# Altium footprint library IFAT6.PcbLib: 65 footprints (part 4 of 5)
Each footprint in its own frame and in the unit in brackets; x right, y up, seen from the top. Pads: shape width x height; smd on the part's side, far side on the other; paste and mask are expansions set on the pad; w line width, h text height; cw(c..) or ccw(c..) is an arc to the next point about the centre after c.
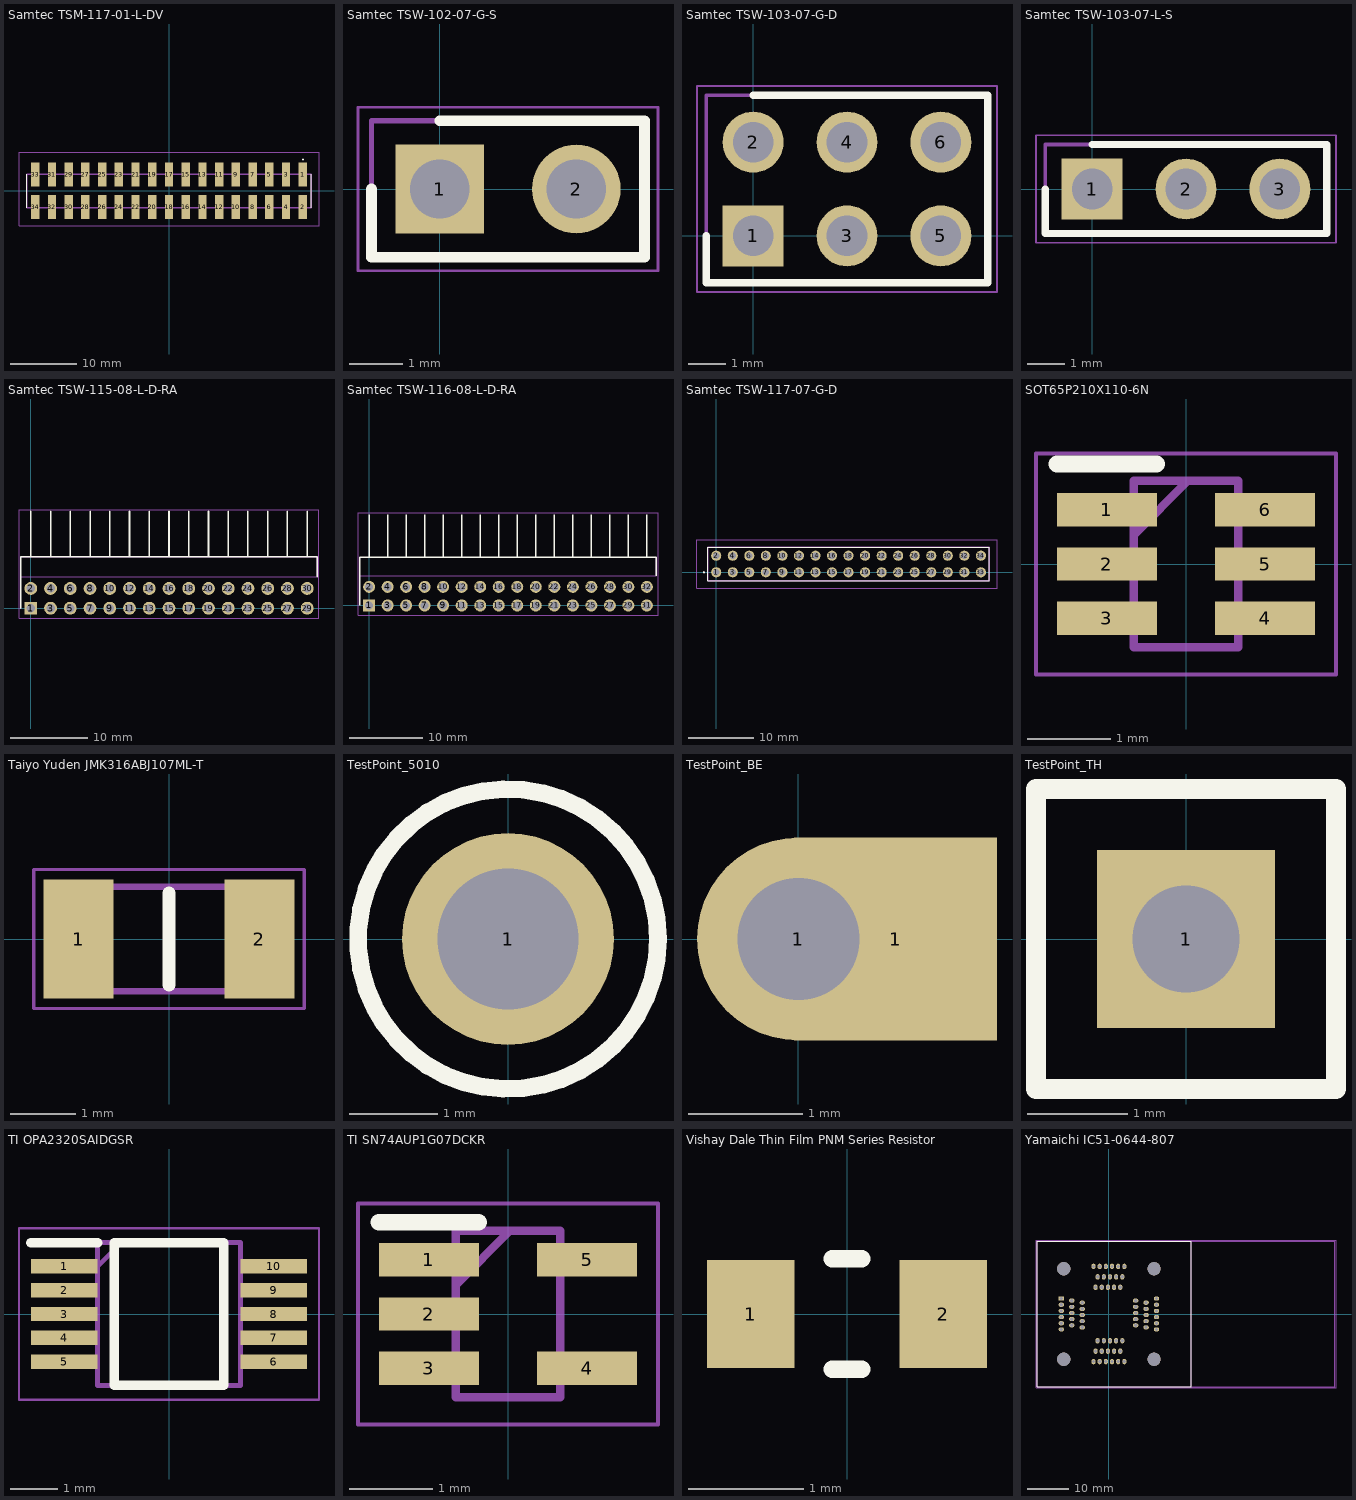
[diagram p3: the footprints below, top view; thin cyan lines are the x and y axes]

## Samtec TSM-117-01-L-DV [mm] "CONN HEADER SMD 34POS 2.54MM"
pads (34):
  rect 1.27x3.68 smd: 1(20.32,2.475) 2(20.32,-2.475) 3(17.78,2.475) 4(17.78,-2.475) 5(15.24,2.475) 6(15.24,-2.475) 7(12.7,2.475) 8(12.7,-2.475) 9(10.16,2.475) 10(10.16,-2.475) 11(7.62,2.475) 12(7.62,-2.475) 13(5.08,2.475) 14(5.08,-2.475) 15(2.54,2.475) 16(2.54,-2.475) 17(0,2.475) 18(0,-2.475) 19(-2.54,2.475) 20(-2.54,-2.475) 21(-5.08,2.475) 22(-5.08,-2.475) 23(-7.62,2.475) 24(-7.62,-2.475) 25(-10.16,2.475) 26(-10.16,-2.475) 27(-12.7,2.475) 28(-12.7,-2.475) 29(-15.24,2.475) 30(-15.24,-2.475) 31(-17.78,2.475) 32(-17.78,-2.475) 33(-20.32,2.475) 34(-20.32,-2.475)
Top Overlay:
  circle w0.2: c20.37,4.775 r0.05
  lines w0.1: -21.59,-2.54 -21.59,2.54 ; 21.59,-2.54 21.59,2.54
Mechanical 13:
  lines w0.2: -21.59,-2.54 21.59,-2.54 21.59,2.54 -21.59,2.54 -21.59,-2.54
Mechanical 15:
  lines w0.05: -22.79,-5.315 22.79,-5.315 22.79,5.875 -22.79,5.875 -22.79,-5.315
3D body "TSM-117-01-L-DV.stp": height 9.66, standoff 0.01, extent -21.59,-3.848 21.59,3.848

## Samtec TSW-102-07-G-S [mm] "CONN HEADER VERT 2POS 2.54MM"
pads (2):
  rect 1.65x1.65 hole 1.1: 1(0,0)
  round 1.65 hole 1.1: 2(2.54,0)
Top Overlay:
  lines w0.2: -1.27,0 -1.27,-1.27 3.81,-1.27 3.81,1.27 0,1.27
Mechanical 13:
  lines w0.1: -1.27,-1.27 3.81,-1.27 3.81,1.27 -1.27,1.27 -1.27,-1.27
Mechanical 15:
  lines w0.05: -1.52,-1.52 4.06,-1.52 4.06,1.52 -1.52,1.52 -1.52,-1.52
3D body "TSW-102-07-G-S-002.stp": height 8.38, standoff -2.54, extent -1.27,-1.27 3.81,1.27

## Samtec TSW-103-07-G-D [mm] "CONN HEADER VERT 6POS 2.54MM"
pads (6):
  rect 1.65x1.65 hole 1.1: 1(0,0)
  round 1.65 hole 1.1: 2(0,2.54) 3(2.54,0) 4(2.54,2.54) 5(5.08,0) 6(5.08,2.54)
Top Overlay:
  lines w0.2: -1.27,0 -1.27,-1.27 6.35,-1.27 6.35,3.81 0,3.81
Mechanical 13:
  lines w0.1: -1.27,-1.27 6.35,-1.27 6.35,3.81 -1.27,3.81 -1.27,-1.27
Mechanical 15:
  lines w0.05: -1.52,-1.52 6.6,-1.52 6.6,4.06 -1.52,4.06 -1.52,-1.52
3D body "TSW-103-07-G-D-001.stp": height 8.38, standoff -2.54, extent -1.27,-1.27 6.35,3.81

## Samtec TSW-103-07-L-S [mm] "CONN HEADER VERT 3POS 2.54MM"
pads (3):
  rect 1.65x1.65 hole 1.1: 1(0,0)
  round 1.65 hole 1.1: 2(2.54,0) 3(5.08,0)
Top Overlay:
  lines w0.2: -1.27,0 -1.27,-1.205 6.35,-1.205 6.35,1.205 0,1.205
Mechanical 13:
  lines w0.1: -1.27,-1.205 -1.27,1.205 6.35,1.205 6.35,-1.205 -1.27,-1.205
Mechanical 15:
  lines w0.05: -1.52,-1.455 -1.52,1.455 6.6,1.455 6.6,-1.455 -1.52,-1.455
3D body "TSW-103-07-G-S-LL.stp": height 8.38, standoff -2.54, extent -1.27,-1.205 6.35,1.205

## Samtec TSW-115-08-L-D-RA [mm] "CONN HEADER R/A 30POS 2.54MM"
pads (30):
  rect 1.65x1.65 hole 1.1: 1(0,0)
  round 1.65 hole 1.1: 2(0,2.54) 3(2.54,0) 4(2.54,2.54) 5(5.08,0) 6(5.08,2.54) 7(7.62,0) 8(7.62,2.54) 9(10.16,0) 10(10.16,2.54) 11(12.7,0) 12(12.7,2.54) 13(15.24,0) 14(15.24,2.54) 15(17.78,0) 16(17.78,2.54) 17(20.32,0) 18(20.32,2.54) 19(22.86,0) 20(22.86,2.54) 21(25.4,0) 22(25.4,2.54) 23(27.94,0) 24(27.94,2.54) 25(30.48,0) 26(30.48,2.54) 27(33.02,0) 28(33.02,2.54) 29(35.56,0) 30(35.56,2.54)
Top Overlay:
  lines w0.2: -1.27,0 -1.27,6.6 36.83,6.6 36.83,4.06 ; 0,6.6 0,12.44 ; 2.54,6.6 2.54,12.44 ; 5.08,6.6 5.08,12.44 ; 7.62,6.6 7.62,12.44 ; 10.16,6.6 10.16,12.44 ; 12.7,6.6 12.7,12.44 ; 15.24,6.6 15.24,12.44 ; 17.78,6.6 17.78,12.44 ; 20.32,6.6 20.32,12.44 ; 22.86,6.6 22.86,12.44 ; 25.4,6.6 25.4,12.44 ; 27.94,6.6 27.94,12.44 ; 30.48,6.6 30.48,12.44 ; 33.02,6.6 33.02,12.44 ; 35.56,6.6 35.56,12.44
Mechanical 13:
  lines w0.1: -1.27,4.06 -1.27,6.6 36.83,6.6 36.83,4.06 -1.27,4.06
Mechanical 15:
  lines w0.05: -1.52,-1.325 37.08,-1.325 37.08,12.69 -1.52,12.69 -1.52,-1.325
3D body "TSW-115-08-L-D-RA.stp": height 6.1, standoff -2.29, extent -1.27,-0.32 36.83,12.44

## Samtec TSW-116-08-L-D-RA [mm] "CONN HEADER R/A 32POS 2.54MM"
pads (32):
  rect 1.65x1.65 hole 1.1: 1(0,0)
  round 1.65 hole 1.1: 2(0,2.54) 3(2.54,0) 4(2.54,2.54) 5(5.08,0) 6(5.08,2.54) 7(7.62,0) 8(7.62,2.54) 9(10.16,0) 10(10.16,2.54) 11(12.7,0) 12(12.7,2.54) 13(15.24,0) 14(15.24,2.54) 15(17.78,0) 16(17.78,2.54) 17(20.32,0) 18(20.32,2.54) 19(22.86,0) 20(22.86,2.54) 21(25.4,0) 22(25.4,2.54) 23(27.94,0) 24(27.94,2.54) 25(30.48,0) 26(30.48,2.54) 27(33.02,0) 28(33.02,2.54) 29(35.56,0) 30(35.56,2.54) 31(38.1,0) 32(38.1,2.54)
Top Overlay:
  lines w0.2: -1.27,0 -1.27,6.6 39.37,6.6 39.37,4.06 ; 0,6.6 0,12.44 ; 2.54,6.6 2.54,12.44 ; 5.08,6.6 5.08,12.44 ; 7.62,6.6 7.62,12.44 ; 10.16,6.6 10.16,12.44 ; 12.7,6.6 12.7,12.44 ; 15.24,6.6 15.24,12.44 ; 17.78,6.6 17.78,12.44 ; 20.32,6.6 20.32,12.44 ; 22.86,6.6 22.86,12.44 ; 25.4,6.6 25.4,12.44 ; 27.94,6.6 27.94,12.44 ; 30.48,6.6 30.48,12.44 ; 33.02,6.6 33.02,12.44 ; 35.56,6.6 35.56,12.44 ; 38.1,6.6 38.1,12.44
Mechanical 13:
  lines w0.1: -1.27,4.06 -1.27,6.6 39.37,6.6 39.37,4.06 -1.27,4.06
Mechanical 15:
  lines w0.05: -1.52,-1.325 39.62,-1.325 39.62,12.69 -1.52,12.69 -1.52,-1.325
3D body "TSW-116-08-L-D-RA.stp": height 6.1, standoff -2.29, extent -1.27,-0.32 39.37,12.44

## Samtec TSW-117-07-G-D [mm] "CONN HEADER VERT 34POS 2.54MM"
pads (34):
  round 1.55 hole 1.02: 1(0,0) 2(0,2.54) 3(2.54,0) 4(2.54,2.54) 5(5.08,0) 6(5.08,2.54) 7(7.62,0) 8(7.62,2.54) 9(10.16,0) 10(10.16,2.54) 11(12.7,0) 12(12.7,2.54) 13(15.24,0) 14(15.24,2.54) 15(17.78,0) 16(17.78,2.54) 17(20.32,0) 18(20.32,2.54) 19(22.86,0) 20(22.86,2.54) 21(25.4,0) 22(25.4,2.54) 23(27.94,0) 24(27.94,2.54) 25(30.48,0) 26(30.48,2.54) 27(33.02,0) 28(33.02,2.54) 29(35.56,0) 30(35.56,2.54) 31(38.1,0) 32(38.1,2.54) 33(40.64,0) 34(40.64,2.54)
Top Overlay:
  circle w0.2: c-1.85,0 r0.05
  lines w0.1: -1.27,-1.27 41.91,-1.27 41.91,3.81 -1.27,3.81 -1.27,-1.27
Mechanical 13:
  lines w0.2: -1.27,-1.27 41.91,-1.27 41.91,3.81 -1.27,3.81 -1.27,-1.27
Mechanical 15:
  lines w0.05: -2.95,-2.47 43.11,-2.47 43.11,5.01 -2.95,5.01 -2.95,-2.47
3D body "TSW-117-07-G-D.stp": height 7.87, standoff -3.05, extent -1.27,-1.27 41.91,3.81

## SOT65P210X110-6N [mm]
pads (6):
  rect 1.2x0.4 smd: 1(-0.95,0.65) 2(-0.95,0) 3(-0.95,-0.65) 4(0.95,-0.65) 5(0.95,0) 6(0.95,0.65)
Top Overlay:
  lines w0.2: -1.55,1.2 -0.35,1.2
Mechanical 13:
  lines w0.1: -0.625,0.35 0.025,1 ; -0.625,-1 -0.625,1 0.625,1 0.625,-1 -0.625,-1
Mechanical 15:
  lines w0.05: -1.8,-1.325 -1.8,1.325 1.8,1.325 1.8,-1.325 -1.8,-1.325
3D body "TLV341AIDCKT.stp": height 1, standoff 0, extent -1.05,-1 1.05,1

## Taiyo Yuden JMK316ABJ107ML-T [mm] "CAP CER 100UF 6.3V X5R 1206"
pads (2):
  rect 1.07x1.82 smd: 1(-1.38,0) 2(1.38,0)
Top Overlay:
  lines w0.2: 0,-0.7 0,0.7
Mechanical 13:
  lines w0.1: -1.6,-0.8 1.6,-0.8 1.6,0.8 -1.6,0.8 -1.6,-0.8
Mechanical 15:
  lines w0.05: -2.065,-1.06 2.065,-1.06 2.065,1.06 -2.065,1.06 -2.065,-1.06
3D body "GRM31CR60J107KE39L.stp": height 1.8, standoff 0, extent -1.6,-0.8 1.6,0.8

## TestPoint_5010 [mm] "Test Point for 5010 THM"
height 8.1
pads (1):
  round 2.4 hole 1.6: 1(0,0)
Top Overlay:
  circle w0.2: c0,0 r1.7
3D body "User Library-TEST POINT RED Keystone 5010.STEP": height 8.13, standoff -3.1, extent -1.587,-1.587 1.587,1.588

## TestPoint_BE [mil] "Testpont for Wired Connection"
pads (2):
  round 70 hole 42: 1(0,0)
  rect 70x70 smd: 1(33.46,0)

## TestPoint_TH [mil] "Testpont for Header 1x1"
pads (1):
  rect 70x70 hole 42: 1(0,0)
Top Overlay:
  lines w7.87: -59.06,-59.06 59.06,-59.06 59.06,59.06 -59.06,59.06 -59.06,-59.06

## TI OPA2320SAIDGSR [mm] "IC OPAMP GP 2 CIRCUIT 8SON"
pads (10):
  rect 1.4x0.3 smd: 1(-2.2,1) 2(-2.2,0.5) 3(-2.2,0) 4(-2.2,-0.5) 5(-2.2,-1) 6(2.2,-1) 7(2.2,-0.5) 8(2.2,0) 9(2.2,0.5) 10(2.2,1)
Top Overlay:
  lines w0.2: -2.9,1.5 -1.5,1.5 ; -1.15,-1.5 1.15,-1.5 1.15,1.5 -1.15,1.5 -1.15,-1.5
Mechanical 13:
  lines w0.1: -1.5,1 -1,1.5 ; -1.5,-1.5 1.5,-1.5 1.5,1.5 -1.5,1.5 -1.5,-1.5
Mechanical 15:
  lines w0.05: -3.15,-1.8 3.15,-1.8 3.15,1.8 -3.15,1.8 -3.15,-1.8
3D body "OPA2320SAIDGSR.stp": height 1.1, standoff 0, extent -2.45,-1.5 2.45,1.5

## TI SN74AUP1G07DCKR [mm] "IC BUF NON-INVERT 3.6V SC70-5"
pads (5):
  rect 1.2x0.4 smd: 1(-0.95,0.65) 2(-0.95,0) 3(-0.95,-0.65) 4(0.95,-0.65) 5(0.95,0.65)
Top Overlay:
  lines w0.2: -1.55,1.1 -0.35,1.1
Mechanical 13:
  lines w0.1: -0.625,0.35 0.025,1 ; -0.625,-1 -0.625,1 0.625,1 0.625,-1 -0.625,-1
Mechanical 15:
  lines w0.05: -1.8,-1.325 -1.8,1.325 1.8,1.325 1.8,-1.325 -1.8,-1.325
3D body "SN74AUP1G07DCKR.stp": height 1.1, standoff 0, extent -1.05,-1 1.05,1

## Vishay Dale Thin Film PNM Series Resistor [mil] "RES SMD 0603"
pads (2):
  rect 30x37 smd: 1(-33,0) 2(33,0)
Top Overlay:
  lines w6: -5,-19 5,-19 ; -5,19 5,19
3D body "PNM0603E5001BST5.stp": height 13.98, standoff 0, extent -29.92,-14.96 29.92,14.96

## Yamaichi IC51-0644-807 [mm] "64 PIN QFP, 0.50MM"
pads (68):
  rect 1.308x1 hole 0.8: 1(-11.58,3.75)
  oval 1.308x1 hole 0.8: 2(-9.04,3.25) 3(-6.5,2.75) 4(-11.58,2.25) 5(-9.04,1.75) 6(-6.5,1.25) 7(-11.58,0.75) 8(-9.04,0.25) 9(-6.5,-0.25) 10(-11.58,-0.75) 11(-9.04,-1.25) 12(-6.5,-1.75) 13(-11.58,-2.25) 14(-9.04,-2.75) 15(-6.5,-3.25) 16(-11.58,-3.75) 33(11.58,-3.75) 34(9.04,-3.25) 35(6.5,-2.75) 36(11.58,-2.25) 37(9.04,-1.75) 38(6.5,-1.25) 39(11.58,-0.75) 40(9.04,-0.25) 41(6.5,0.25) 42(11.58,0.75) 43(9.04,1.25) 44(6.5,1.75) 45(11.58,2.25) 46(9.04,2.75) 47(6.5,3.25) 48(11.58,3.75)
  oval 1x1.308 hole 0.8: 17(-3.75,-11.58) 18(-3.25,-9.04) 19(-2.75,-6.5) 20(-2.25,-11.58) 21(-1.75,-9.04) 22(-1.25,-6.5) 23(-0.75,-11.58) 24(-0.25,-9.04) 25(0.25,-6.5) 26(0.75,-11.58) 27(1.25,-9.04) 28(1.75,-6.5) 29(2.25,-11.58) 30(2.75,-9.04) 31(3.25,-6.5) 32(3.75,-11.58) 49(3.75,11.58) 50(3.25,9.04) 51(2.75,6.5) 52(2.25,11.58) 53(1.75,9.04) 54(1.25,6.5) 55(0.75,11.58) 56(0.25,9.04) 57(-0.25,6.5) 58(-0.75,11.58) 59(-1.25,9.04) 60(-1.75,6.5) 61(-2.25,11.58) 62(-2.75,9.04) 63(-3.25,6.5) 64(-3.75,11.58)
  round 3.2 hole 3.2 unplated: ""(-11,-11) ""(-11,11) ""(11,-11) ""(11,11)
Top Overlay:
  lines w0.127: -17.5,-17.75 -17.5,17.75 20,17.75 20,-17.75 -17.5,-17.75
Mechanical 13:
  lines w0.127: 20,-17.75 -17.5,-17.75 -17.5,17.75 20,17.75 ; 20,-17.75 20,17.75 ; 20,-17.75 55,-17.75 55,17.75 20,17.75
Mechanical 15:
  lines w0.05: -17.75,-18 55.25,-18 55.25,18 -17.75,18 -17.75,-18
3D body "IC51-0644-807--3DModel-STEP-56544.STEP": height 18.6, standoff -2.9, extent -20,-17.75 21.965,17.75